# Altium footprint library General.PcbLib: 128 footprints (part 1 of 8)
Each footprint in its own frame and in the unit in brackets; x right, y up, seen from the top. Pads: shape width x height; smd on the part's side, far side on the other; paste and mask are expansions set on the pad; w line width, h text height; cw(c..) or ccw(c..) is an arc to the next point about the centre after c.
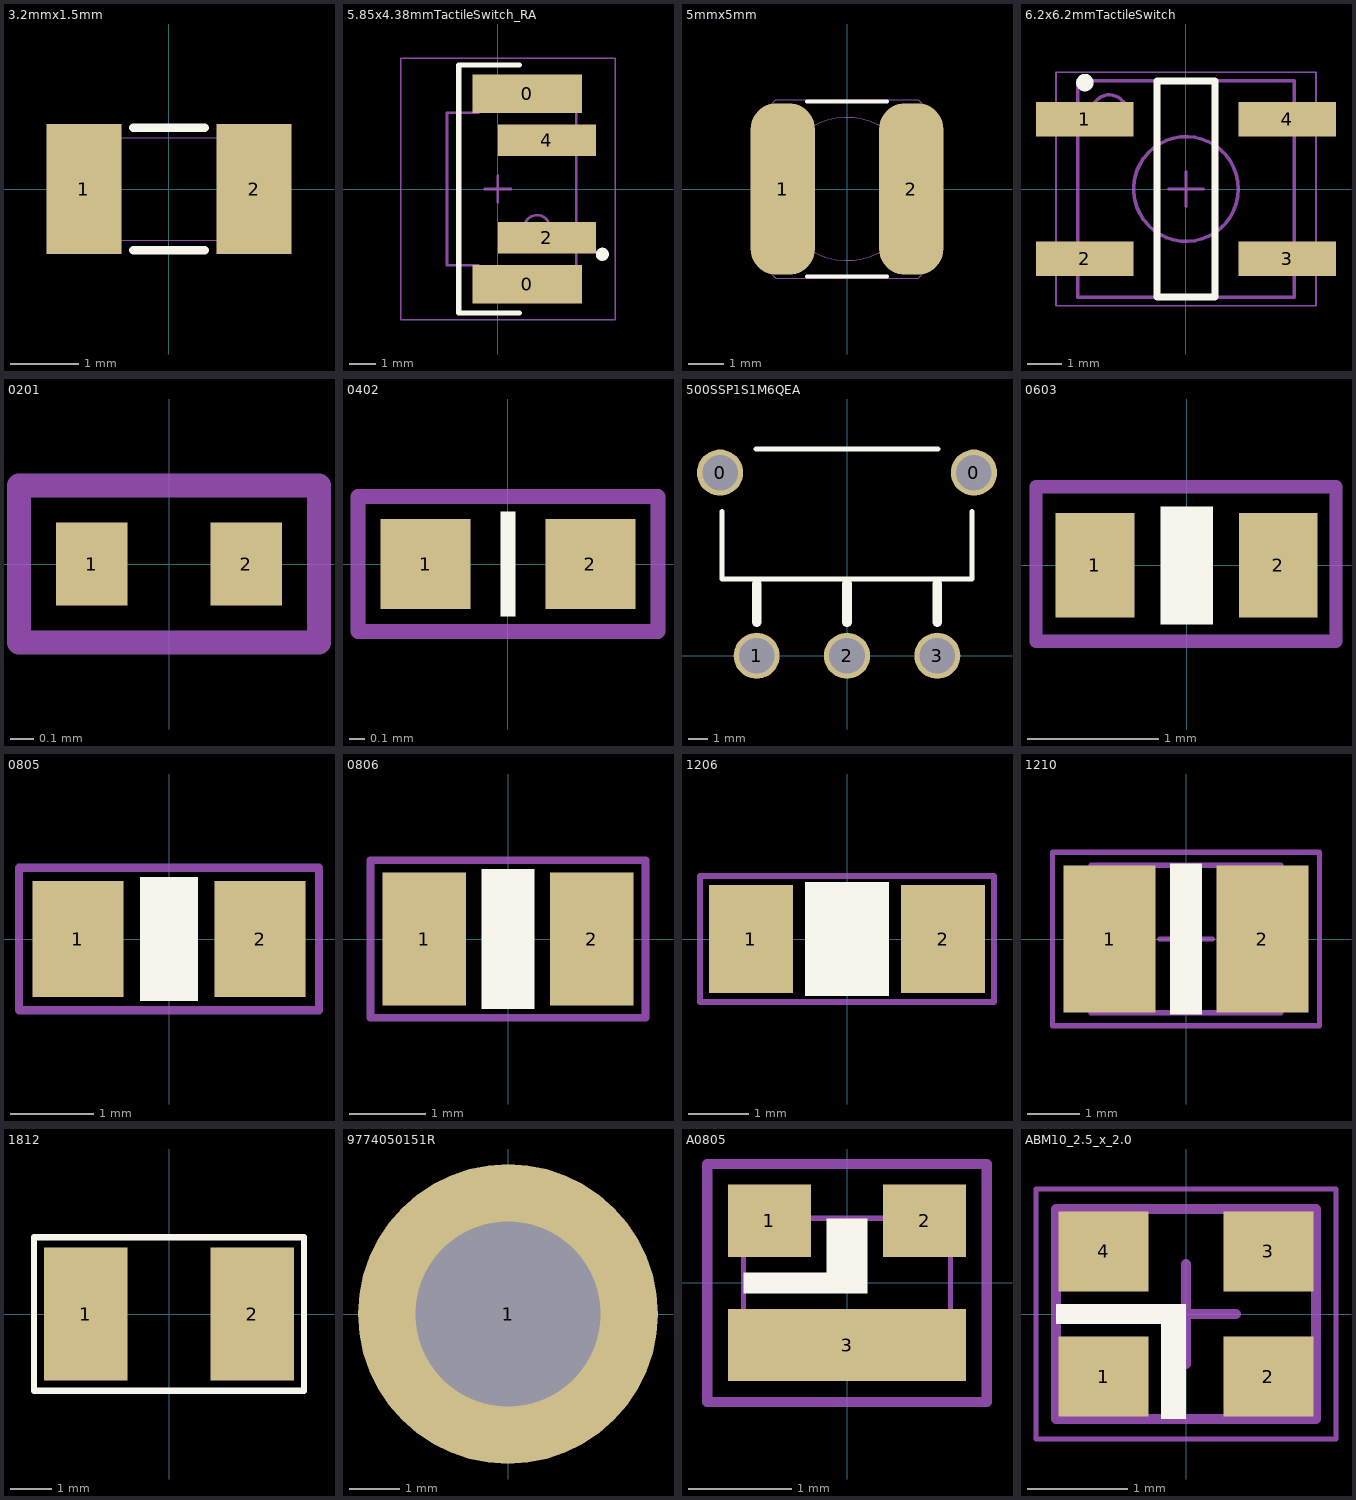
[diagram p0: the footprints below, top view; thin cyan lines are the x and y axes]

## 3.2mmx1.5mm [mm]
pads (2):
  rect 1.1x1.9 smd: 1(-1.25,0) 2(1.25,0)
Top Overlay:
  lines w0.127: -0.525,-0.9 0.525,-0.9 ; -0.525,0.9 0.525,0.9
Mechanical 1:
  lines w0: -1.6,-0.75 -1.6,0.75 1.5,0.75 1.5,-0.75 -1.6,-0.75
3D body: height 0.9, standoff 0, extent -1.6,-0.75 1.5,0.75

## 5.85x4.38mmTactileSwitch_RA [mm] "SOJ, 2-Leads, Body 5.85x4.38mm, Pitch 2.54mm, Right Angle"
height 6.6
pads (4):
  rect 4.19x1.46 smd: 0(1.12,-3.65) 0(1.12,3.65)
  rect 3.76x1.205 smd: 2(1.88,-1.873) 4(1.88,1.873)
Top Overlay:
  circle w0.25: c4,-2.5 r0.125
  lines w0.2: 0.825,-4.75 -1.5,-4.75 -1.5,4.75 0.825,4.75
Mechanical 13:
  circle w0.1: c1.5,-1.5 r0.5
  lines w0.1: -1.95,-2.925 -1.95,2.925 -0.75,2.925 -0.75,3.785 3,3.785 3,-3.785 -0.75,-3.785 -0.75,-2.925 -1.95,-2.925
Mechanical 15:
  lines w0.05: -3.725,-5 -3.725,5 4.5,5 4.5,-5 -3.725,-5
  lines w0.1: -0.5,0 0.5,0 ; 0,-0.5 0,0.5
3D body: height 6.6, standoff 0.3, extent -1.95,-2.925 2.98,2.925
3D body: height 4.68, standoff 1.68, extent -3.5,-1.494 -1.5,1.494
3D body: height 0.3, standoff 0.1, extent -0.745,-3.785 2.98,3.785

## 5mmx5mm [mm]
pads (2):
  rrect80% 1.8x4.8 smd: 1(-1.8,0) 2(1.8,0)
Top Overlay:
  lines w0.1: -1.125,-2.45 1.125,-2.45 ; -1.125,2.45 1.125,2.45
Mechanical 1:
  circle w0: c0,0 r2
  lines w0: -2.5,-2 -2,-2.5 2,-2.5 2.5,-2 2.5,2 2,2.5 0,2.5 -2,2.5 -2.5,2 -2.5,-2
3D body: height 2, standoff 0, extent -1.999,-1.999 1.999,1.999
3D body: height 1.9, standoff 0, extent -2.501,-2.501 2.501,2.501

## 6.2x6.2mmTactileSwitch [mm] "SOJ, 4-Leads, Body 6.20x6.80mm, Pitch 4.00mm, IPC Medium Density"
height 2.9
pads (4):
  rect 2.8x1 smd: 1(-2.9,2) 2(-2.9,-2) 3(2.9,-2) 4(2.9,2)
Top Overlay:
  circle w0.25: c-2.9,3.05 r0.125
  lines w0.2: -0.825,-3.1 0.825,-3.1 0.825,3.1 -0.825,3.1 -0.825,-3.1
Mechanical 13:
  circle w0.1: c0,0 r1.5
  circle w0.1: c-2.2,2.2 r0.5
  lines w0.1: -3.1,-3.1 3.1,-3.1 3.1,3.1 -3.1,3.1 -3.1,-3.1
Mechanical 15:
  lines w0.05: -3.725,-3.35 3.725,-3.35 3.725,3.35 -3.725,3.35 -3.725,-3.35
  lines w0.1: -0.5,0 0.5,0 ; 0,-0.5 0,0.5
3D body: height 4.3, standoff 0.5, extent -1.499,-1.499 1.499,1.499
3D body: height 2.9, standoff 0.1, extent -3.1,-3.1 3.1,3.1

## 0201 [mm]
pads (2):
  rect 0.3x0.351 smd: 1(-0.325,0) 2(0.325,0)
Mechanical 15:
  lines w0.1: -0.63,-0.33 0.63,-0.33 0.63,0.33 -0.63,0.33 -0.63,-0.33
3D body "User Library-SMD CAPACITOR (2).step": height 0.31, standoff 0.01, extent -0.3,-0.15 0.3,0.15

## 0402 [mm]
pads (2):
  rect 0.6x0.6 smd: 1(-0.55,0) 2(0.55,0)
Top Overlay:
  rectangle: -0.05,-0.35 0.05,0.35
Mechanical 15:
  lines w0.1: -1,-0.45 -1,0.45 1,0.45 1,-0.45 -1,-0.45
3D body "User Library-SMD CAPACITOR (1).step": height 0.51, standoff 0.01, extent -0.5,-0.25 0.5,0.25

## 500SSP1S1M6QEA [mm] "SWITCH SLIDE SPDT"
pads (5):
  round 2.4 hole 1.85: 0(-6.605,9.53) 0(6.605,9.53) 1(-4.7,0) 2(0,0) 3(4.7,0)
Top Overlay:
  lines w0.254: -6.5,7.5 -6.5,4 6.5,4 6.5,7.5 ; -4.75,10.75 4.75,10.75
  lines w0.5: -4.7,1.75 -4.7,3.75 ; 0,1.75 0,3.75 ; 4.7,1.75 4.7,3.75
3D body "500SSPxS1M6xEA.stp": height 6.61, standoff -3.17, extent -6.785,-0.66 6.785,15.53

## 0603 [mm]
pads (2):
  rect 0.6x0.8 smd: 1(-0.7,0) 2(0.7,0)
Top Overlay:
  rectangle: -0.2,-0.45 0.2,0.45
Mechanical 15:
  lines w0.1: -1.15,-0.58 1.14,-0.58 1.14,-0.14 1.14,0.6 -1.15,0.6 -1.15,0.15 -1.15,-0.35 -1.15,-0.58
3D body "SW3DPS-CAPACITOR 0603-DEFAULT.STEP": height 0.87, standoff 0.01, extent -0.8,-0.43 0.8,0.43

## 0805 [mm]
pads (2):
  rect 1.1x1.4 smd: 1(-1.1,0) 2(1.1,0)
Top Overlay:
  rectangle: -0.35,-0.75 0.35,0.75
Mechanical 15:
  lines w0.1: -1.81,-0.86 -1.81,0.86 1.81,0.86 1.81,-0.86 -1.81,-0.86
3D body "SW3dPS-0805 SMD Capacitor.step": height 0.78, standoff 0, extent -1,-0.625 1,0.625

## 0806 [mm]
pads (2):
  rect 1.1x1.75 smd: 1(-1.1,0) 2(1.1,0)
Top Overlay:
  rectangle: -0.35,-0.92 0.35,0.92
Mechanical 15:
  lines w0.1: -1.81,-1.035 -1.81,1.035 1.81,1.035 1.81,-1.035 -1.81,-1.035
3D body "SW3dPS-0805 SMD Capacitor.step": height 0.78, standoff 0, extent -1,-0.625 1,0.625

## 1206 [mm]
pads (2):
  rect 1.4x1.8 smd: 1(-1.6,0) 2(1.6,0)
Top Overlay:
  rectangle: -0.7,-0.95 0.7,0.95
Mechanical 15:
  lines w0.1: -2.451,-1.051 -2.451,1.051 2.451,1.051 2.451,-1.051 -2.451,-1.051
3D body "SW3dPS-1206 SMD Capacitor.step": height 1, standoff 0, extent -1.6,-0.8 1.6,0.8

## 1210 [mm] "2-Leads, Body 3.2x2.5mm, IPC Medium Density"
height 2.8
pads (2):
  rect 1.75x2.8 smd: 1(-1.452,0) 2(1.452,0)
Top Overlay:
  rectangle: -0.305,-1.44 0.305,1.44
Mechanical 13:
  lines w0.1: -1.8,-1.4 -1.8,1.4 1.8,1.4 1.8,-1.4 -1.8,-1.4
Mechanical 15:
  lines w0.1: -0.5,0 0.5,0 ; 0,-0.5 0,0.5 ; -2.54,-1.65 -2.54,1.65 2.54,1.65 2.54,-1.65 -2.54,-1.65
3D body "SW3dPS-CAPC3225.STEP": height 2.5, standoff 0, extent -1.6,-1.25 1.6,1.25

## 1812 [mm]
pads (2):
  rect 2x3.2 smd: 1(-2,0) 2(2,0)
Top Overlay:
  lines w0.152: -3.238,-1.841 -3.238,1.841 3.238,1.841 3.238,-1.841 -3.238,-1.841
3D body "SW3dPS-1812 SMD Capacitor.STEP": height 1.6, standoff 0, extent -2.25,-1.6 2.25,1.6

## 9774050151R [mm] "SMD Standoff 3.8mm dia hole, 5mm height"
height 5
pads (1):
  round 6 / inner round 0 / far side round 4.5 hole 3.7 paste-403.566 mask+0.102: 1(0,0)
Top Paste:
  region: 2.939,-0.25 2.917,-0.508 2.784,-1.009 2.566,-1.478 2.269,-1.903 1.903,-2.269 1.478,-2.566 1.009,-2.784 0.508,-2.917 0.25,-2.939 0.25,-1.883 0.403,-1.857 0.699,-1.767 0.977,-1.629 1.229,-1.449 1.449,-1.229 1.629,-0.977 1.767,-0.7 1.857,-0.403 1.883,-0.25
  region: -0.25,-2.939 -0.508,-2.917 -1.009,-2.784 -1.478,-2.566 -1.903,-2.269 -2.269,-1.903 -2.566,-1.478 -2.784,-1.009 -2.917,-0.508 -2.939,-0.25 -1.883,-0.25 -1.857,-0.403 -1.767,-0.699 -1.629,-0.977 -1.449,-1.229 -1.229,-1.449 -0.977,-1.629 -0.7,-1.767 -0.403,-1.857 -0.25,-1.883
  region: -2.939,0.25 -2.917,0.508 -2.784,1.009 -2.566,1.478 -2.269,1.903 -1.903,2.269 -1.478,2.566 -1.009,2.784 -0.508,2.917 -0.25,2.939 -0.25,1.883 -0.403,1.857 -0.699,1.767 -0.977,1.629 -1.229,1.449 -1.449,1.229 -1.629,0.977 -1.767,0.7 -1.857,0.403 -1.883,0.25
  region: 0.25,2.939 0.508,2.917 1.009,2.784 1.478,2.566 1.903,2.269 2.269,1.903 2.566,1.478 2.784,1.009 2.917,0.508 2.939,0.25 1.883,0.25 1.857,0.403 1.767,0.699 1.629,0.977 1.449,1.229 1.229,1.449 0.977,1.629 0.7,1.767 0.403,1.857 0.25,1.883
Mechanical 13:
  circle w0.15: c0,0 r2.55
3D body "9774050151R (rev1).stp": height 5, standoff -1.4, extent -2.55,-2.547 2.55,2.547

## A0805 [mm] "Attenuator SMT, 4 PIN"
height 0.4
pads (3):
  rect 0.8x0.7 smd: 1(-0.75,0.6) 2(0.75,0.6)
  rect 2.3x0.7 smd: 3(0,-0.6)
Top Overlay:
  rectangle: -1,-0.1 0.2,0.1
  rectangle: -0.2,-0.1 0.2,0.625
Mechanical 13:
  lines w0.05: -1,-0.625 0,-0.625 1,-0.625 1,0 1,0.625 0,0.625 -1,0.625 -1,0 -1,-0.625
Mechanical 15:
  lines w0.1: -1.35,-1.15 -1.35,1.15 1.35,1.15 1.35,-1.15 -1.35,-1.15
3D body "SW3dPS-0805 SMD Resistor.step": height 0.85, standoff 0, extent -1,-0.625 1,0.625

## ABM10_2.5_x_2.0 [mm] "Cristal, 4-Pins, Body 2.50x2.00mm"
height 0.95
pads (4):
  rect 0.9x0.8 smd: 1(-0.825,-0.625) 2(0.825,-0.625) 3(0.825,0.625) 4(-0.825,0.625)
Top Overlay:
  rectangle: -1.3,-0.1 0,0.1
  rectangle: -0.25,-1.05 0,0
Mechanical 13:
  lines w0.1: -1.3,-1.05 -1.3,1.05 1.3,1.05 1.3,-1.05 -1.3,-1.05
Mechanical 15:
  lines w0.05: -1.5,-1.25 -1.5,1.25 1.5,1.25 1.5,-1.25 -1.5,-1.25
  lines w0.1: -0.5,0 0.5,0 ; 0,-0.5 0,0.5
3D body: height 0.95, standoff 0, extent -1.3,-1.05 1.3,1.05